# Altium footprint library iMag.PcbLib: 52 footprints (part 4 of 4)
Each footprint in its own frame and in the unit in brackets; x right, y up, seen from the top. Pads: shape width x height; smd on the part's side, far side on the other; paste and mask are expansions set on the pad; w line width, h text height; cw(c..) or ccw(c..) is an arc to the next point about the centre after c.
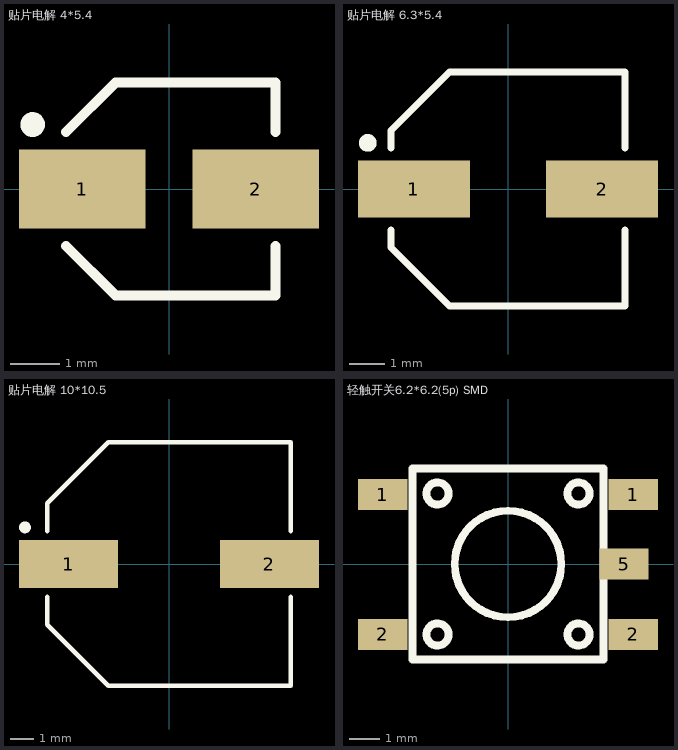
[diagram p3: the footprints below, top view; thin cyan lines are the x and y axes]

## 贴片电解 4*5.4 [mm] "贴片电解 4*5.4"
pads (2):
  rect 2.55x1.6 smd: 1(-1.75,0) 2(1.75,0)
Top Overlay:
  circle w0.25: c-2.75,1.3 r0.125
  lines w0.2: -2.075,-1.15 -1.075,-2.15 2.15,-2.15 2.15,-1.15 ; -2.075,1.15 -1.075,2.15 2.15,2.15 2.15,1.15

## 贴片电解 6.3*5.4 [mm] "贴片电解 6.3*5.4"
pads (2):
  rect 3.15x1.6 smd: 1(-2.65,0) 2(2.65,0)
Top Overlay:
  circle w0.25: c-3.95,1.3 r0.125
  lines w0.2: -3.3,-1.15 -3.3,-1.65 -1.65,-3.3 3.3,-3.3 3.3,-1.15 ; -3.3,1.15 -3.3,1.65 -1.65,3.3 3.3,3.3 3.3,1.15
3D body "User Library-ALU-D.STEP": height 5.4, standoff 0, extent -3.5,-3.3 3.5,3.3

## 贴片电解 10*10.5 [mm]
pads (2):
  rect 4.2x2.05 smd: 1(-4.25,0) 2(4.25,0)
Top Overlay:
  circle w0.25: c-6.1,1.55 r0.125
  lines w0.2: -5.15,-1.4 -5.15,-2.575 -2.575,-5.15 5.15,-5.15 5.15,-1.4 ; -5.15,1.4 -5.15,2.575 -2.575,5.15 5.15,5.15 5.15,1.4
3D body "User Library-ALU-G.STEP": height 10.2, standoff 0, extent -5.8,-5.15 5.8,5.15

## 轻触开关6.2*6.2(5p) SMD [mm]
pads (5):
  rect 1.6x1 smd: 1(-4.064,2.25) 1(4.064,2.25) 2(-4.064,-2.286) 2(4.064,-2.286) 5(3.764,0)
Top Overlay:
  circle w0.254: c0,0 r1.727
  circle w0.254: c-2.286,2.286 r0.359
  circle w0.254: c2.286,2.286 r0.359
  circle w0.254: c-2.286,-2.286 r0.359
  circle w0.254: c2.286,-2.286 r0.359
  lines w0.254: -3.1,-3.1 3.1,-3.1 3.1,3.1 -3.1,3.1 -3.1,-3.1
3D body "User Library-222CMVABR.STEP": height 2.5, standoff 0, extent -4,-3.2 4,3.2